# Altium integrated library BYTECH_HW_LIB_2019.IntLib: 907 symbols (part 1 of 6)
Pins are listed as number, name and electrical type; pins without a type are passive.

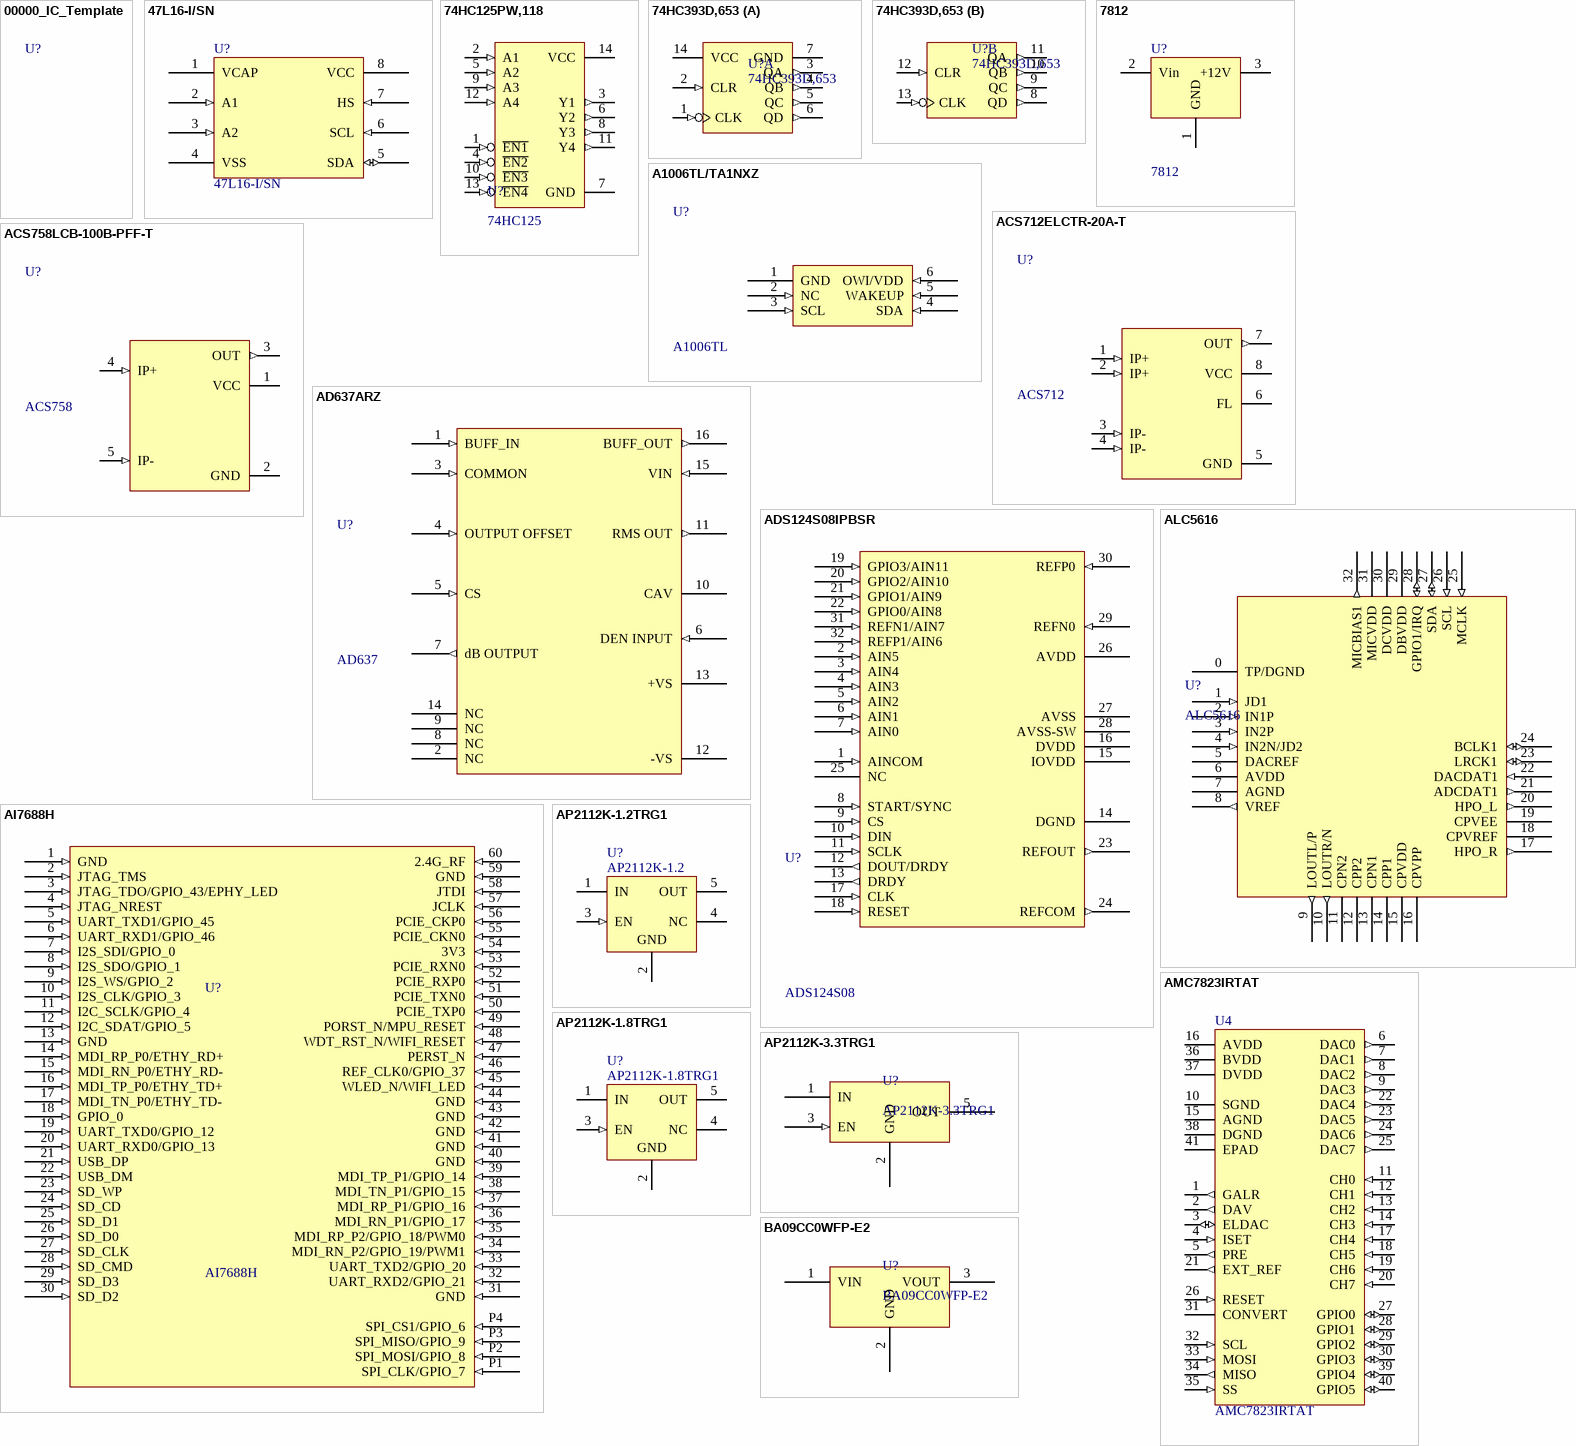
[diagram p0: symbols 00000_IC_Template to BA09CC0WFP-E2]

## 00000_IC_Template
designator U?
Solder: SMT; Category: IC
footprint SOIC-8

## 47L16-I/SN
designator U?
IC EERAM 16KBIT 1MHz SOIC-8; Solder: SMT; MPN: 47L16-I/SN; Value: 47L16-I/SN; Category: IC; PinCount: 8
footprint SOIC-8
pins: 1 VCAP, 2 A1 (in), 3 A2 (in), 4 VSS (power), 5 SDA (io), 6 SCL (in), 7 HS (in), 8 VCC (power)

## 74HC125PW,118
designator U?, comment 74HC125
Quad buffer/line driver; 3-state 14TSSOP; MPN: 74HC125PW,118; Solder: SMT; Value: 74HC125; Category: IC
footprint TSOP65P640X110-14M (TSOP, 14-Leads, Body 5.00x4.40mm, Pitch 0.65mm, IPC Low Density)
footprint TSOP65P640X120-14N (TSOP, 14-Leads, Body 5.00x4.40mm, Pitch 0.65mm, IPC Medium Density)
pins: 1 ~{EN1} (in), 2 A1 (in), 3 Y1 (out), 4 ~{EN2} (in), 5 A2 (in), 6 Y2 (out), 7 GND (power), 8 Y3 (out), 9 A3 (in), 10 ~{EN3} (in), 11 Y4 (out), 12 A4 (in), 13 ~{EN4} (in), 14 VCC (power)

## 74HC393D,653
designator U?
IC COUNTER DUAL 4BIT BIN 14SOIC; Solder: SMT; MPN: 74HC393D,653; Value: 74HC393D,653; Category: IC
footprint SOIC-14 (Small Outline IC (SOIC), 1.27 mm pitch; 14 pin, 8.65 mm L X 3.90 mm W X 1.75 mm H body)
part A pins: 1 CLK (in), 2 CLR (in), 3 QA (out), 4 QB (out), 5 QC (out), 6 QD (out), 7 GND (power), 14 VCC (power)
part B pins: 8 QD (out), 9 QC (out), 10 QB (out), 11 QA (out), 12 CLR (in), 13 CLK (in)

## 7812
designator U?
Positive Voltage Regulator; PinCount: 3
footprint HDR1x3 BIG (3 chan cam 7805, BJT to, FET to...)
pins: 1 GND, 2 Vin, 3 +12V

## A1006TL/TA1NXZ
designator U?, comment A1006TL
IC SECURE AUTHENTICATOR 6HXSON; MPN: A1006TL/TA1NXZ; MFR: NXP USA Inc.; Solder: SMT; Value: A1006TL; Category: IC; PinCount: 6
footprint 6-HXSON (SON, 6-Leads, Body 2.00x2.00mm, Pitch 0.65mm, Thermal Pad 1.60x1.00mm, IPC Medium Density)
pins: 1 GND, 2 NC (in), 3 SCL (in), 4 SDA (in), 5 WAKEUP (in), 6 OWI/VDD (in)

## ACS712ELCTR-20A-T
designator U?, comment ACS712
SENSOR CURRENT HALL 20A AC/DC; MPN: ACS712ELCTR-20A-T; MFR: Allegro; Solder: SMT; Value: ACS712; Category: IC; PinCount: 8
footprint SOIC-8
pins: 1 IP+ (in), 2 IP+ (in), 3 IP- (in), 4 IP- (in), 5 GND, 6 FL, 7 OUT (out), 8 VCC

## ACS758LCB-100B-PFF-T
designator U?, comment ACS758
SENSOR CURRENT HALL 100A AC/DC; MPN: ACS758LCB-100B-PFF-T; MFR: Allegro MicroSystems; Solder: SMT; Value: ACS758; Category: IC; PinCount: 5
footprint ACS758LCB (Footprint not found)
pins: 1 VCC, 2 GND, 3 OUT (out), 4 IP+ (in), 5 IP- (in)

## AD637ARZ
designator U?, comment AD637
IC RMS TO DC CONVERTER 16SOIC; MPN: AD637ARZ; MFR: Analog Devices Inc.; Solder: SMT; Value: AD637; Category: IC; PinCount: 16
footprint DW16_N (SOIC, 16-Leads, Body 10.3x7.5mm, Pitch 1.27mm, IPC Medium Density)
pins: 1 BUFF_IN (in), 2 NC, 3 COMMON (in), 4 OUTPUT OFFSET (in), 5 CS (in), 6 DEN INPUT (in), 7 dB OUTPUT (out), 8 NC, 9 NC, 10 CAV, 11 RMS OUT (out), 12 -VS (power), 13 +VS (power), 14 NC, 15 VIN (in), 16 BUFF_OUT (out)

## ADS124S08IPBSR
designator U?, comment ADS124S08
IC ADC 24BIT SIGMA-DELTA 32LQFP; MPN: ADS124S08IPBSR; MFR: Texas Instruments; Solder: SMT; Value: ADS124S08; Category: IC
footprint TSQFP50P700X700X120-32N (TSQFP, 32-Leads, Body 5.00x5.00mm, Pitch 0.50mm, IPC Medium Density)
pins: 1 AINCOM (in) "Common analog input for single-ended measurements", 2 AIN5 (in) "Analog input 5", 3 AIN4 (in) "Analog input 4", 4 AIN3 (in) "Analog input 3", 5 AIN2 (in) "Analog input 2", 6 AIN1 (in) "Analog input 1", 7 AIN0 (in) "Analog input 0", 8 START/SYNC (in) "Start conversion", 9 CS (in) "Chip select; active low", 10 DIN (in) "Serial data input", 11 SCLK (in) "Serial clock input", 12 DOUT/DRDY (out) "Serial data output combined with data ready; active low", 13 DRDY (out) "Data ready; active low", 14 DGND (power) "Digital ground", 15 IOVDD (power) "Digital I/O power supply.", 16 DVDD (power) "Digital core power supply. Connect a 100-nF (or larger) capacitor to DGND.", 17 CLK (in) "External clock input. Connect to DGND to use the internal oscillator.", 18 RESET (in) "Reset; active low", 19 GPIO3/AIN11 (in) "General-purpose I/O(2); analog input 11 (ADS124S08 only)", 20 GPIO2/AIN10 (in) "General-purpose I/O(2); analog input 10 (ADS124S08 only)", 21 GPIO1/AIN9 (in) "General-purpose I/O(2); analog input 9 (ADS124S08 only)", 22 GPIO0/AIN8 (in) "General-purpose I/O(2); analog input 8 (ADS124S08 only)", 23 REFOUT (out) "Positive voltage reference output.", 24 REFCOM (out) "Negative voltage reference output. Connect to AVSS.", 25 NC "Leave unconnected or connect to AVSS", 26 AVDD (power) "Positive analog power supply. Connect a 330-nF (or larger) capacitor to AVSS.", 27 AVSS (power) "Negative analog power supply", 28 AVSS-SW (power) "Negative analog power supply; low-side switch. Connect to AVSS.", 29 REFN0 (in) "Negative external reference input 0", 30 REFP0 (in) "Positive external reference input 0", 31 REFN1/AIN7 (in) "Negative external reference input 1; analog input 7 (ADS124S08 only)", 32 REFP1/AIN6 (in) "Positive external reference input 1; analog input 6 (ADS124S08 only)"

## AI7688H
designator U?
MT7688 IoT SiP Module; MFR: ACSIP; Solder: SMT; MPN: AI7688H; Value: AI7688H; Category: MODULE; PinCount: 60
footprint AI7688H
footprint AI7688H-NoAT (Footprint not found)
pins: 1 GND (in), 2 JTAG_TMS (in), 3 JTAG_TDO/GPIO_43/EPHY_LED (in), 4 JTAG_NREST (in), 5 UART_TXD1/GPIO_45 (in), 6 UART_RXD1/GPIO_46 (in), 7 I2S_SDI/GPIO_0 (in), 8 I2S_SDO/GPIO_1 (in), 9 I2S_WS/GPIO_2 (in), 10 I2S_CLK/GPIO_3 (in), 11 I2C_SCLK/GPIO_4 (in), 12 I2C_SDAT/GPIO_5 (in), 13 GND (in), 14 MDI_RP_P0/ETHY_RD+ (in), 15 MDI_RN_P0/ETHY_RD- (in), 16 MDI_TP_P0/ETHY_TD+ (in), 17 MDI_TN_P0/ETHY_TD- (in), 18 GPIO_0 (in), 19 UART_TXD0/GPIO_12 (in), 20 UART_RXD0/GPIO_13 (in), 21 USB_DP (in), 22 USB_DM (in), 23 SD_WP (in), 24 SD_CD (in), 25 SD_D1 (in), 26 SD_D0 (in), 27 SD_CLK (in), 28 SD_CMD (in), 29 SD_D3 (in), 30 SD_D2 (in), 31 GND (in), 32 UART_RXD2/GPIO_21 (in), 33 UART_TXD2/GPIO_20 (in), 34 MDI_RN_P2/GPIO_19/PWM1 (in), 35 MDI_RP_P2/GPIO_18/PWM0 (in), 36 MDI_RN_P1/GPIO_17 (in), 37 MDI_RP_P1/GPIO_16 (in), 38 MDI_TN_P1/GPIO_15 (in), 39 MDI_TP_P1/GPIO_14 (in), 40 GND (in), 41 GND (in), 42 GND (in), 43 GND (in), 44 GND (in), 45 WLED_N/WIFI_LED (in), 46 REF_CLK0/GPIO_37 (in), 47 PERST_N (in), 48 WDT_RST_N/WIFI_RESET (in), 49 PORST_N/MPU_RESET (in), 50 PCIE_TXP0 (in), 51 PCIE_TXN0 (in), 52 PCIE_RXP0 (in), 53 PCIE_RXN0 (in), 54 3V3 (in), 55 PCIE_CKN0 (in), 56 PCIE_CKP0 (in), 57 JCLK (in), 58 JTDI (in), 59 GND (in), 60 2.4G_RF (in), P1 SPI_CLK/GPIO_7 (in), P2 SPI_MOSI/GPIO_8 (in), P3 SPI_MISO/GPIO_9 (in), P4 SPI_CS1/GPIO_6 (in)

## ALC5616
designator U?
Solder: SMT
footprint VFQFN-32 (32-VFQFN Exposed Pad)
pins: 0 TP/DGND (power) "Analog ground", 1 JD1 (in) "First jack detection pin", 2 IN1P (in) "Single-end input for microphone 1", 3 IN2P (in) ""Positive differential input for microphone / 2 / Left channel line input"", 4 IN2N/JD2 (in) ""Negative differential input for / microphone 2 / Right channel line input / Second jack detection pin"", 5 DACREF (power) "Analog power", 6 AVDD (power) "Analog power", 7 AGND (power) "Analog ground", 8 VREF (out) "Internal reference voltage", 9 LOUTL/P (out) ""Line output type / Left channel single-end output / Positive channel differential output"", 10 LOUTR/N (out) ""Line output type / Right channel single-end output / Negative channel differential output"", 11 CPN2 "Second charge pump bucket capacitor", 12 CPP2 "Second charge pump bucket capacitor", 13 CPN1 "First charge pump bucket capacitor", 14 CPP1 "First charge pump bucket capacitor", 15 CPVDD (power) ""Analog power for headphone charge / pump"", 16 CPVPP (power) "Charge pump positive voltage output", 17 HPO_R (out) ""Headphone amplifier output / Right channel"", 18 CPVREF "Headphone reference ground", 19 CPVEE (power) "Charge pump negative voltage output", 20 HPO_L (out) ""Headphone amplifier output / Left channel"", 21 ADCDAT1 (out) "First I2S interface serial data output", 22 DACDAT1 (in) "First I2S interface serial data input", 23 LRCK1 (io) "First I2S interface synchronous signal", 24 BCLK1 (io) "First I2S interface serial bit clock", 25 MCLK (in) "I2S interface master clock input", 26 SCL (in) "I2C interface clock input", 27 SDA (io) "I2C interface serial data", 28 GPIO1/IRQ (io) ""General purpose input and output / Interrupt output"", 29 DBVDD (power) "Digital power for digital I/O buffer", 30 DCVDD (power) "Digital power for digital core.", 31 MICVDD (power) "Analog power for MICBIAS", 32 MICBIAS1 (out) "Bias voltage output for microphone"

## AMC7823IRTAT
designator U4
IC ANLG MON/CTL 12B 200K 40WQFN; Solder: SMT; MPN: AMC7823IRTAT; Value: AMC7823IRTAT; Category: IC
footprint 40-WQFN (WFN, 40-lead, Body 6x6 mm, 0.5 mm pitch,IPC High Density)
pins: 1 GALR (out), 2 DAV (out), 3 ELDAC (io), 4 ISET (in), 5 PRE (out), 6 DAC0 (out), 7 DAC1 (out), 8 DAC2 (out), 9 DAC3 (out), 10 SGND (power), 11 CH0 (in), 12 CH1 (in), 13 CH2 (in), 14 CH3 (in), 15 AGND (power), 16 AVDD (power), 17 CH4 (in), 18 CH5 (in), 19 CH6 (in), 20 CH7 (in), 21 EXT_REF (out), 22 DAC4 (out), 23 DAC5 (out), 24 DAC6 (out), 25 DAC7 (out), 26 RESET (in), 27 GPIO0 (io), 28 GPIO1 (io), 29 GPIO2 (io), 30 GPIO3 (io), 31 CONVERT, 32 SCL (in), 33 MOSI (in), 34 MISO (out), 35 SS (in), 36 BVDD (power), 37 DVDD (power), 38 DGND (power), 39 GPIO4 (io), 40 GPIO5 (io), 41 EPAD (power)

## AP2112K-1.2TRG1
designator U?, comment AP2112K-1.2
Single Output LDO, 300 mA, Fixed 1.2V Output, 2 to 5.5 V Input; MPN: AP2112K-1.2TRG1; Solder: SMT; Value: AP2112K-1.2; Category: IC
footprint SOT23-5
pins: 1 IN (power) "Input supply voltage", 2 GND (power) "Ground", 3 EN (in) "Enable input", 4 NC "No connected", 5 OUT (power) "Regulated output voltage"

## AP2112K-1.8TRG1
designator U?
Single Output LDO, 300 mA, Fixed 1.8 V Output, 2 to 5.5 V Input; Solder: SMT; MPN: AP2112K-1.8TRG1; Value: AP2112K-1.8TRG1; Category: IC
footprint SOT23-5
pins: 1 IN (power) "Input supply voltage", 2 GND (power) "Ground", 3 EN (in) "Enable input", 4 NC "No connected", 5 OUT (power) "Regulated output voltage"

## AP2112K-3.3TRG1
designator U?
IC REG LDO 3.3V 0.6A SOT25; Solder: SMT; MPN: AP2112K-3.3TRG1; Value: AP2112K-3.3TRG1; Category: IC
footprint SOT23-5
pins: 1 IN (power), 2 GND (power), 3 EN (in), 5 OUT (power)

## BA09CC0WFP-E2
designator U?
LDO Voltage Regulators REG 1A 9V; Solder: SMT; MPN: BA09CC0WFP-E2; Value: BA09CC0WFP-E2; Category: IC
footprint TO-252-3
pins: 1 VIN, 2 GND, 3 VOUT

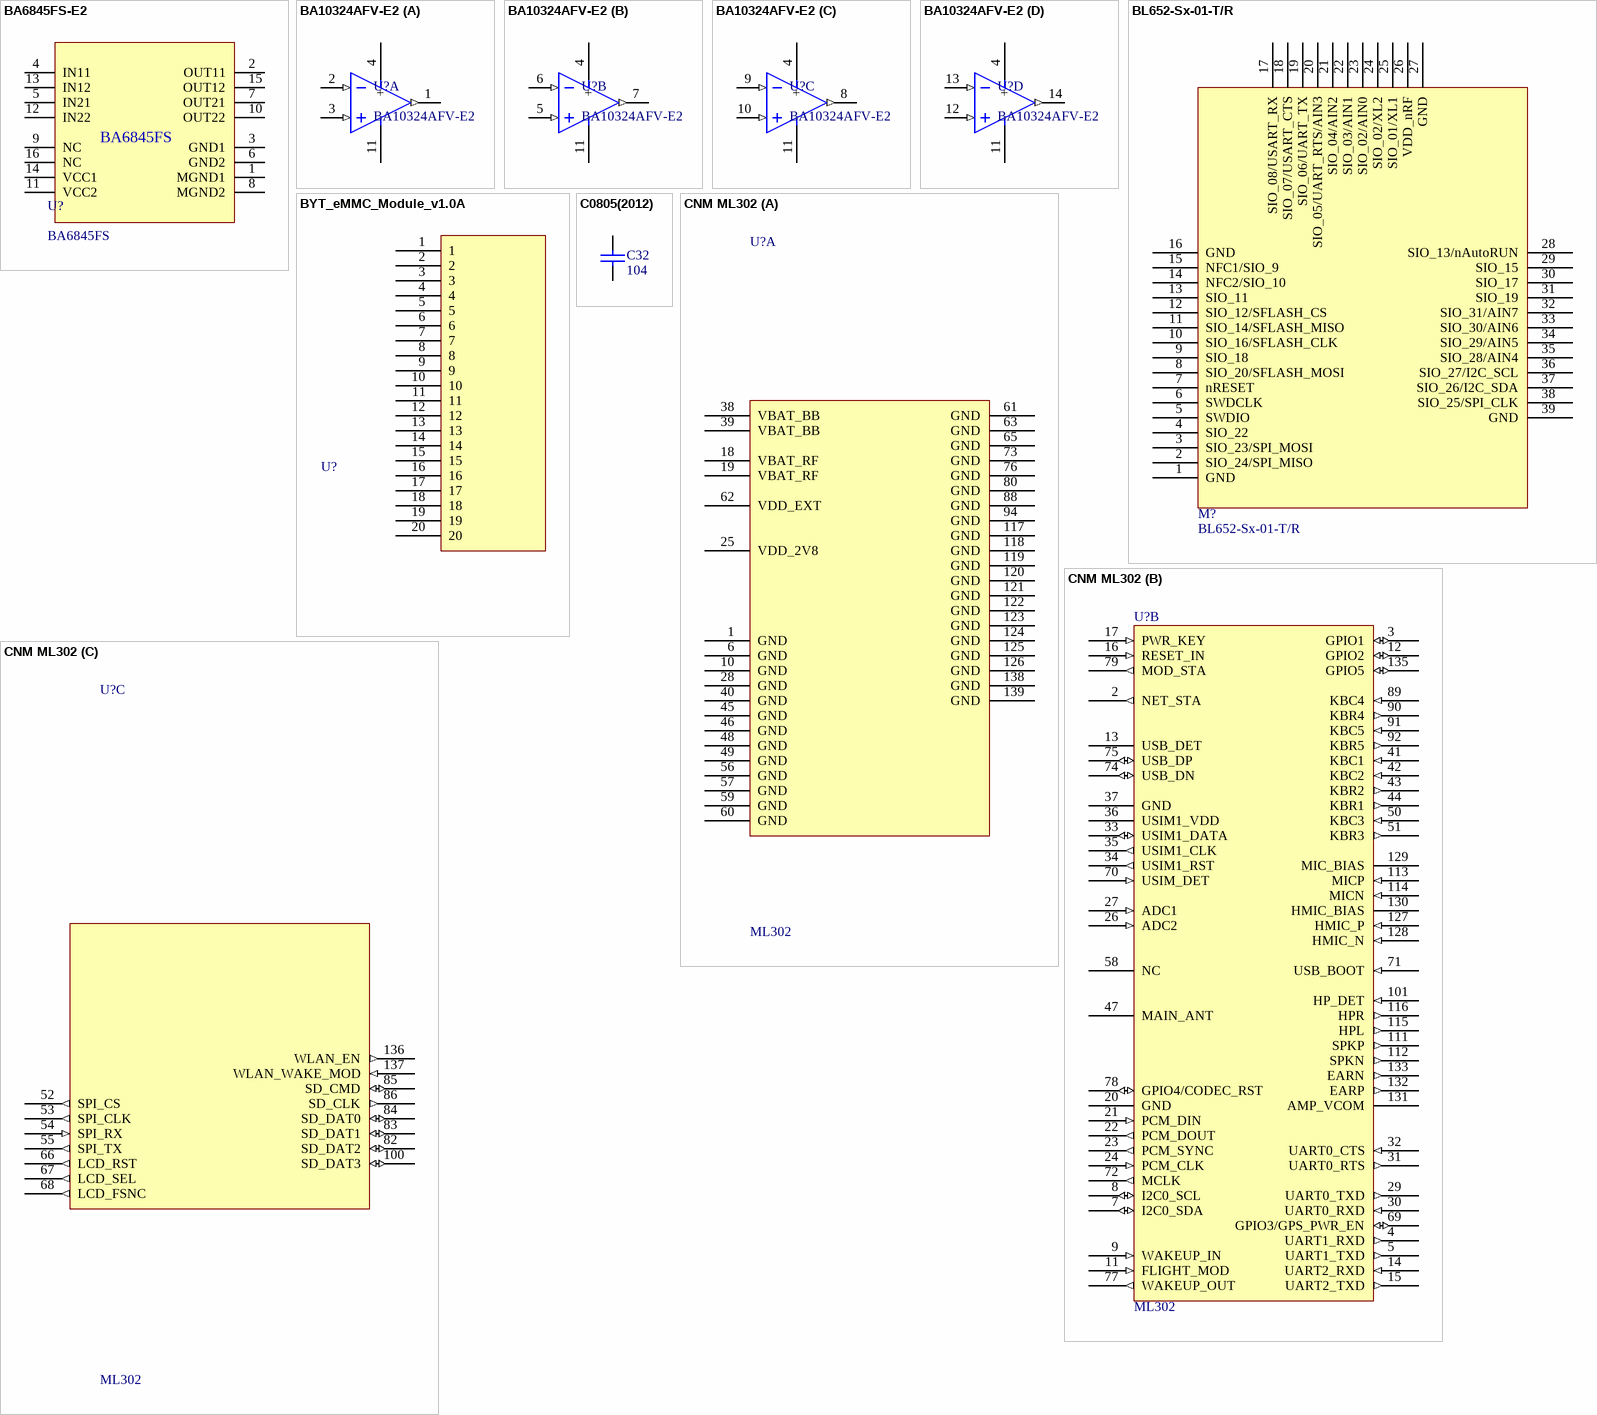
[diagram p1: symbols BA6845FS-E2 to CNM ML302]

## BA6845FS-E2
designator U?, comment BA6845FS
IC MOTOR DRIVER PAR 16SSOP - Stepping motor driver; MPN: BA6845FS-E2; Solder: SMT; Value: BA6845FS; Category: IC
footprint SSOP-A16 (SSOP-A16 IC PACKAGE)
pins: 1 MGND1, 2 OUT11, 3 GND1, 4 IN11, 5 IN21, 6 GND2, 7 OUT21, 8 MGND2, 9 NC, 10 OUT22, 11 VCC2, 12 IN22, 13 IN12, 14 VCC1, 15 OUT12, 16 NC

## BA10324AFV-E2
designator U?
IC OPAMP DIFF 500KHZ 14SSOP; MFR: ROHM; Solder: SMT; MPN: BA10324AFV-E2; Category: IC; Value: BA10324AFV-E2
footprint 14-SSOPB (Footprint not found)
part A pins: 1 OUT (out), 2 IN- (in), 3 IN+ (in), 4 + (power), 11 VEE (power)
part B pins: 4 + (power), 5 IN+ (in), 6 IN- (in), 7 OUT (out), 11 VEE (power)
part C pins: 4 + (power), 8 OUT (out), 9 IN- (in), 10 IN+ (in), 11 VEE (power)
part D pins: 4 + (power), 11 VEE (power), 12 IN+ (in), 13 IN- (in), 14 OUT (out)

## BL652-Sx-01-T/R
designator M?
Solder: SMT; Value: BL652-Sx-01-T/R
footprint BL652-Sx-01-T/R
pins: 1 GND (power), 2 SIO_24/SPI_MISO (power), 3 SIO_23/SPI_MOSI (power), 4 SIO_22 (power), 5 SWDIO (power), 6 SWDCLK (power), 7 nRESET (power), 8 SIO_20/SFLASH_MOSI (power), 9 SIO_18 (power), 10 SIO_16/SFLASH_CLK (power), 11 SIO_14/SFLASH_MISO (power), 12 SIO_12/SFLASH_CS (power), 13 SIO_11 (power), 14 NFC2/SIO_10 (power), 15 NFC1/SIO_9 (power), 16 GND (power), 17 SIO_08/USART_RX (power), 18 SIO_07/USART_CTS (power), 19 SIO_06/UART_TX (power), 20 SIO_05/UART_RTS/AIN3 (power), 21 SIO_04/AIN2 (power), 22 SIO_03/AIN1 (power), 23 SIO_02/AIN0 (power), 24 SIO_02/XL2 (power), 25 SIO_01/XL1 (power), 26 VDD_nRF (power), 27 GND (power), 28 SIO_13/nAutoRUN (power), 29 SIO_15 (power), 30 SIO_17 (power), 31 SIO_19 (power), 32 SIO_31/AIN7 (power), 33 SIO_30/AIN6 (power), 34 SIO_29/AIN5 (power), 35 SIO_28/AIN4 (power), 36 SIO_27/I2C_SCL (power), 37 SIO_26/I2C_SDA (power), 38 SIO_25/SPI_CLK (power), 39 GND (power)

## BYT_eMMC_Module_v1.0A
designator U?
MPN: BYT-eMMC; Solder: SMT; Category: IC
footprint BYT-eMMC (Footprint not found)
pins: 1, 2, 3, 4, 5, 6, 7, 8, 9, 10, 11, 12, 13, 14, 15, 16, 17, 18, 19, 20

## C0805(2012)
designator C32, comment 104
Capacitor SMD 0805(2012); Value: 33p; Published: 8-Jun-2000; LatestRevisionDate: 17-Jul-2002; LatestRevisionNote: Re-released for DXP Platform.; PackageReference: RAD-0.3; Publisher: Altium Limited
simulation model CAP (Capacitor)
signal-integrity model Cap
footprint CAP_CERAMIC_0805(2012mm)
pins: 1, 2

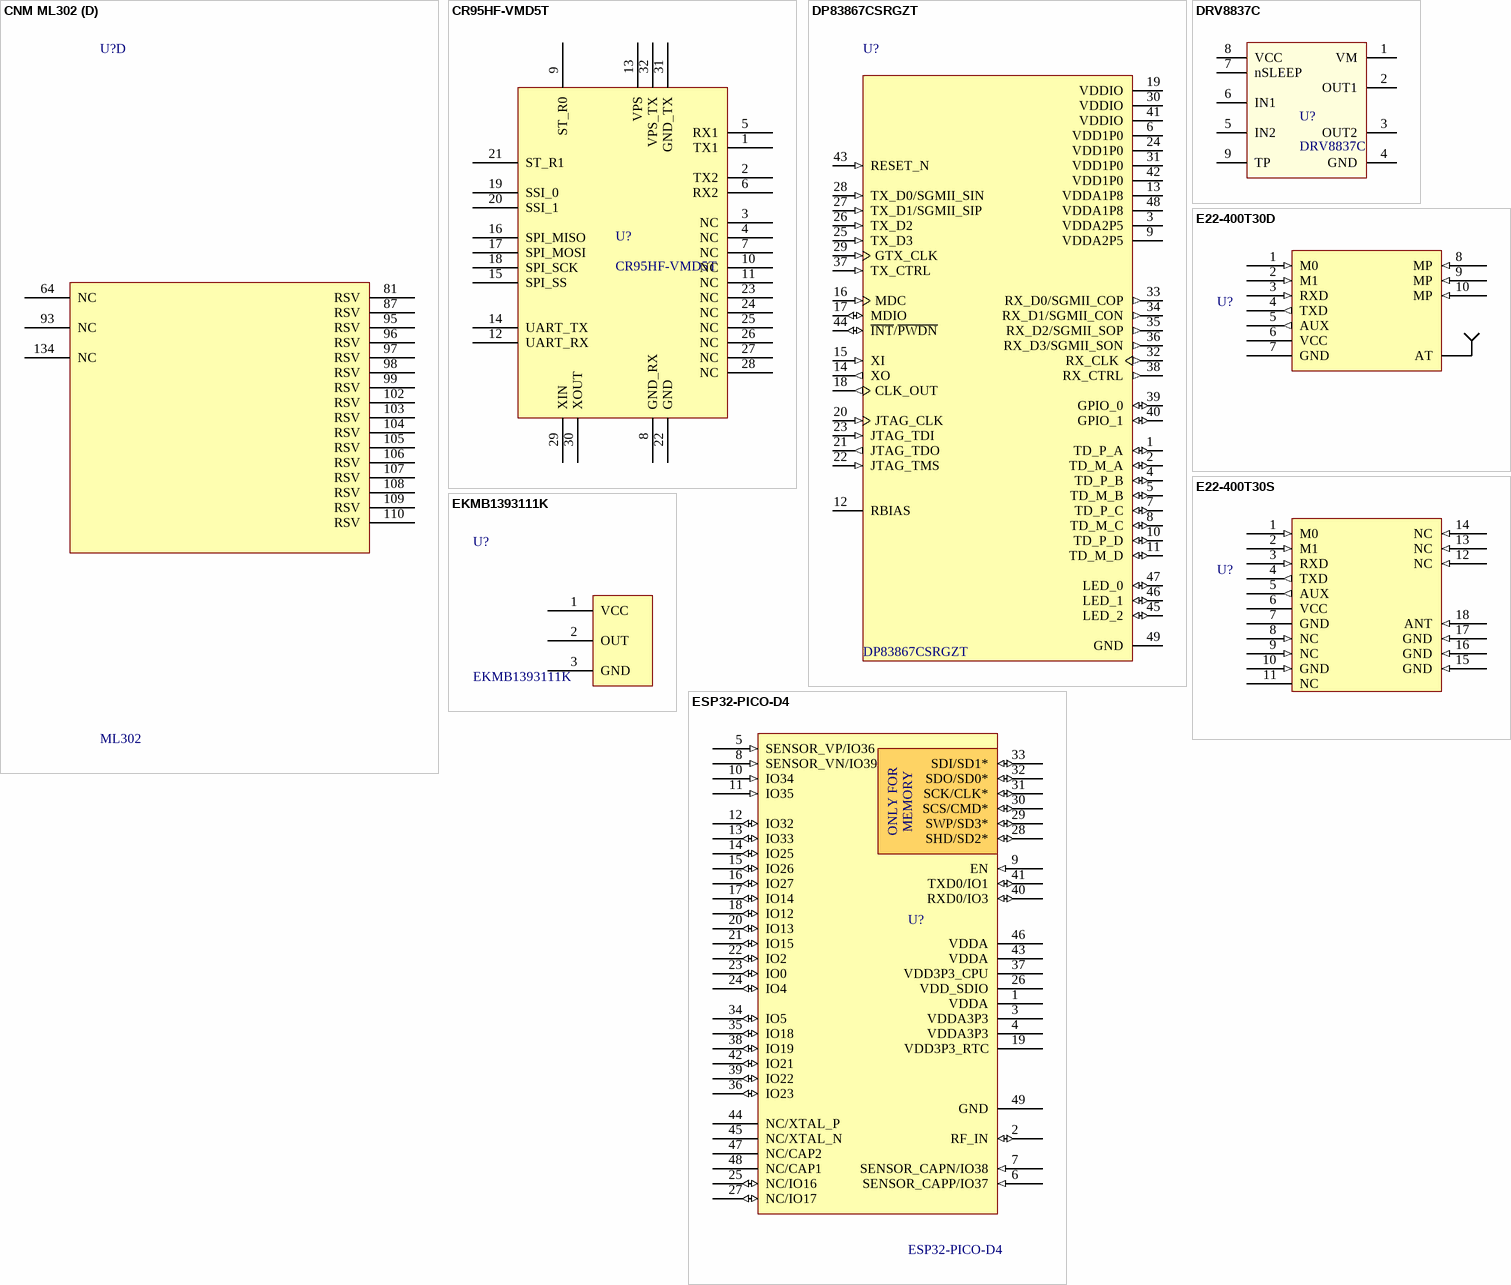
[diagram p2: symbols CNM ML302 to ESP32-PICO-D4]

## CNM ML302
designator U?, comment ML302
LTE CAT 1 Module, B1/B3/B5/B8; MFR: China Mobile; Solder: SMT; Value: ML302; MPN: ML302; Category: MODULE
footprint CNM_ML302 (Footprint not found)
part A pins: 1 GND (power), 6 GND (power), 10 GND (power), 18 VBAT_RF (power), 19 VBAT_RF (power), 25 VDD_2V8 (power), 28 GND (power), 38 VBAT_BB (power), 39 VBAT_BB (power), 40 GND (power), 45 GND (power), 46 GND (power), 48 GND (power), 49 GND (power), 56 GND (power), 57 GND (power), 59 GND (power), 60 GND (power), 61 GND (power), 62 VDD_EXT (power), 63 GND (power), 65 GND (power), 73 GND (power), 76 GND (power), 80 GND (power), 88 GND (power), 94 GND (power), 117 GND (power), 118 GND (power), 119 GND (power), 120 GND (power), 121 GND (power), 122 GND (power), 123 GND (power), 124 GND (power), 125 GND (power), 126 GND (power), 138 GND (power), 139 GND (power)
part B pins: 2 NET_STA (out), 3 GPIO1 (io), 4 UART1_RXD (out), 5 UART1_TXD (out), 7 I2C0_SDA (io), 8 I2C0_SCL (io), 9 WAKEUP_IN (in), 11 FLIGHT_MOD (in), 12 GPIO2 (io), 13 USB_DET (power), 14 UART2_RXD (in), 15 UART2_TXD (out), 16 RESET_IN (in), 17 PWR_KEY (in), 20 GND (power), 21 PCM_DIN (in), 22 PCM_DOUT (out), 23 PCM_SYNC (out), 24 PCM_CLK (in), 26 ADC2 (in), 27 ADC1 (in), 29 UART0_TXD (out), 30 UART0_RXD (in), 31 UART0_RTS (out), 32 UART0_CTS (in), 33 USIM1_DATA (io), 34 USIM1_RST (out), 35 USIM1_CLK (out), 36 USIM1_VDD (power), 37 GND (power), 41 KBC1 (in), 42 KBC2 (in), 43 KBR2 (out), 44 KBR1 (out), 47 MAIN_ANT, 50 KBC3 (in), 51 KBR3 (out), 58 NC, 69 GPIO3/GPS_PWR_EN (io), 70 USIM_DET (in), 71 USB_BOOT (in), 72 MCLK (out), 74 USB_DN (io), 75 USB_DP (io), 77 WAKEUP_OUT (out), 78 GPIO4/CODEC_RST (io), 79 MOD_STA (out), 89 KBC4 (in), 90 KBR4 (out), 91 KBC5 (in), 92 KBR5 (out), 101 HP_DET (in), 111 SPKP (out), 112 SPKN (out), 113 MICP (in), 114 MICN (in), 115 HPL (out), 116 HPR (out), 127 HMIC_P (in), 128 HMIC_N (in), 129 MIC_BIAS (power), 130 HMIC_BIAS (power), 131 AMP_VCOM, 132 EARP (out), 133 EARN (out), 135 GPIO5 (io)
part C pins: 52 SPI_CS (out), 53 SPI_CLK (out), 54 SPI_RX (in), 55 SPI_TX (out), 66 LCD_RST (out), 67 LCD_SEL (out), 68 LCD_FSNC (out), 82 SD_DAT2 (io), 83 SD_DAT1 (io), 84 SD_DAT0 (io), 85 SD_CMD (io), 86 SD_CLK (out), 100 SD_DAT3 (io), 136 WLAN_EN (out), 137 WLAN_WAKE_MOD (in)
part D pins: 64 NC, 81 RSV, 87 RSV, 93 NC, 95 RSV, 96 RSV, 97 RSV, 98 RSV, 99 RSV, 102 RSV, 103 RSV, 104 RSV, 105 RSV, 106 RSV, 107 RSV, 108 RSV, 109 RSV, 110 RSV, 134 NC

## CR95HF-VMD5T
designator U?
TRANSCEIVER 13.56MHZ 32-VFQFPN; Solder: SMT; Value: CR95HF-VMD5T; MPN: CR95HF-VMD5T; Category: IC
footprint VFQFN-32 (32-VFQFN Exposed Pad)
pins: 1 TX1, 2 TX2, 3 NC, 4 NC, 5 RX1, 6 RX2, 7 NC, 8 GND_RX, 9 ST_R0, 10 NC, 11 NC, 12 UART_RX, 13 VPS, 14 UART_TX, 15 SPI_SS, 16 SPI_MISO, 17 SPI_MOSI, 18 SPI_SCK, 19 SSI_0, 20 SSI_1, 21 ST_R1, 22 GND, 23 NC, 24 NC, 25 NC, 26 NC, 27 NC, 28 NC, 29 XIN, 30 XOUT, 31 GND_TX, 32 VPS_TX

## DP83867CSRGZT
designator U?
IC ETHERNET PHY 48VQFN; MF: Texas Instruments; Digi-Key_Part_Number: 296-43820-1-ND; MP: DP83867CSRGZT; SnapEDA_Link: https://www.snapeda.com/parts/DP83867CSRGZT/Texas%20Instruments/view-part/381146/?ref=snap; Digi-Key_Purchase_URL: https://www.digikey.com/product-detail/en/texas-instruments/DP83867CSRGZT/296-43820-1-ND/5872927?utm_source=snapeda&utm_medium=aggregator&utm_campaign=symbol; Package: VQFN-48 Texas Instruments; Value: *
footprint QFN50P700X700X100-49N
pins: 1 TD_P_A (io), 2 TD_M_A (io), 3 VDDA2P5 (power), 4 TD_P_B (io), 5 TD_M_B (io), 6 VDD1P0 (power), 7 TD_P_C (io), 8 TD_M_C (io), 9 VDDA2P5 (power), 10 TD_P_D (io), 11 TD_M_D (io), 12 RBIAS, 13 VDDA1P8 (power), 14 XO (out), 15 XI (in), 16 MDC (in), 17 MDIO (io), 18 CLK_OUT (out), 19 VDDIO (power), 20 JTAG_CLK (in), 21 JTAG_TDO (out), 22 JTAG_TMS (in), 23 JTAG_TDI (in), 24 VDD1P0 (power), 25 TX_D3 (in), 26 TX_D2 (in), 27 TX_D1/SGMII_SIP (in), 28 TX_D0/SGMII_SIN (in), 29 GTX_CLK (in), 30 VDDIO (power), 31 VDD1P0 (power), 32 RX_CLK (out), 33 RX_D0/SGMII_COP (out), 34 RX_D1/SGMII_CON (out), 35 RX_D2/SGMII_SOP (out), 36 RX_D3/SGMII_SON (out), 37 TX_CTRL (in), 38 RX_CTRL (out), 39 GPIO_0 (io), 40 GPIO_1 (io), 41 VDDIO (power), 42 VDD1P0 (power), 43 RESET_N (in), 44 ~{INT}/~{PWDN} (io), 45 LED_2 (io), 46 LED_1 (io), 47 LED_0 (io), 48 VDDA1P8 (power), 49 GND (power)

## DRV8837C
designator U?
IC HALF-BRIDGE DRVR PWM 8WSON; MPN: DRV8837CDSGR; MFR: Texas Instruments; Solder: SMT; Category: IC; Value: DRV8837C
footprint 8WSON-2x2 (Footprint not found)
pins: 1 VM, 2 OUT1, 3 OUT2, 4 GND, 5 IN2, 6 IN1, 7 nSLEEP, 8 VCC, 9 TP

## E22-400T30D
designator U?
LORA MODULE 410.125～ 493.125MHz 100mW; MPN: E22-400T30D/E32-433T20D; MFR: EBYTE; Solder: SMT; Category: IC
footprint EBYTE_E22_E32_DIP (Footprint not found)
pins: 1 M0 (in), 2 M1 (in), 3 RXD (in), 4 TXD (out), 5 AUX (out), 6 VCC (power), 7 GND (power), 8 MP (in), 9 MP (in), 10 MP (in), ?1 AT

## E22-400T30S
designator U?
LORA MODULE 410.125～ 493.125MHz 100mW; MPN: E22-400T30S; MFR: EBYTE; Solder: SMT; Category: IC
footprint EBYTE_E22-400T30S (Footprint not found)
pins: 1 M0 (in), 2 M1 (in), 3 RXD (in), 4 TXD (out), 5 AUX (out), 6 VCC (power), 7 GND (power), 8 NC (in), 9 NC (in), 10 GND (in), 11 NC, 12 NC (in), 13 NC (in), 14 NC (in), 15 GND (in), 16 GND (in), 17 GND (in), 18 ANT (in)

## EKMB1393111K
designator U?
SENSOR MOTION PIR STD WHT LENS S; MFR: Panasonic Electric Works; Solder: HAND; MPN: EKMB1393111K; Value: EKMB1393111K; Category: IC; PinCount: 3
footprint EKMB1393111K (Footprint not found)
pins: 1 VCC, 2 OUT, 3 GND

## ESP32-PICO-D4
designator U?
ESP32 WIFI BLUETOOTH; MFR: Espressif; Solder: SMT; Category: MODULE; MPN: ESP32-PICO-D4; PinCount: 48; Value: ESP32-PICO-D4
footprint ESP32-PICO-D4 (Footprint not found)
pins: 1 VDDA (power) "Power supply", 2 RF_IN (io) "Power supply", 3 VDDA3P3 (power) "Power supply", 4 VDDA3P3 (power) "Power supply", 5 SENSOR_VP/IO36 (in) "GPIO36, ADC1_CH0, RTC_GPIO0", 6 SENSOR_CAPP/IO37 (in) "GPIO39, ADC1_CH3, RTC_GPIO3", 7 SENSOR_CAPN/IO38 (in) "GPIO39, ADC1_CH3, RTC_GPIO3", 8 SENSOR_VN/IO39 (in) "GPIO39, ADC1_CH3, RTC_GPIO3", 9 EN (in) "Module-enable signal. Active high.", 10 IO34 (in) "GPIO34, ADC1_CH6, RTC_GPIO4", 11 IO35 (in) "GPIO35, ADC1_CH7, RTC_GPIO5", 12 IO32 (io) "GPIO32, XTAL_32K_P, ADC1_CH4, TOUCH9, RTC_GPIO9", 13 IO33 (io) "GPIO33, XTAL_32K_N, ADC1_CH5,TOUCH8, RTC_GPIO8", 14 IO25 (io) "GPIO25, DAC_1, ADC2_CH8, RTC_GPIO6, EMAC_RXD0", 15 IO26 (io) "GPIO26, DAC_2, ADC2_CH9, RTC_GPIO7, EMAC_RXD1", 16 IO27 (io) "GPIO27, ADC2_CH7, TOUCH7, RTC_GPIO17, EMAC_RX_DV", 17 IO14 (io) "GPIO14, ADC2_CH6, TOUCH6, RTC_GPIO16, MTMS, HSPICLK, HS2_CLK, SD_CLK, EMAC_TXD2", 18 IO12 (io) "GPIO12, ADC2_CH5, TOUCH5, RTC_GPIO15, MTDI, HSPIQ, HS2_DATA2, SD_DATA2, EMAC_TXD3", 19 VDD3P3_RTC (power) "Power supply", 20 IO13 (io) "GPIO13, ADC2_CH4, TOUCH4, RTC_GPIO14, MTCK, HSPID, HS2_DATA3,SD_DATA3, EMAC_RX_ER", 21 IO15 (io) "GPIO15, ADC2_CH3, TOUCH3, MTDO, HSPICS0, RTC_GPIO13, HS2_CMD,SD_CMD, EMAC_RXD3", 22 IO2 (io) "GPIO2, ADC2_CH2, TOUCH2, RTC_GPIO12, HSPIWP, HS2_DATA0,SD_DATA0", 23 IO0 (io) "GPIO0, ADC2_CH1, TOUCH1, RTC_GPIO11, CLK_OUT1, EMAC_TX_CLK", 24 IO4 (io) "GPIO4, ADC2_CH0, TOUCH0, RTC_GPIO10, HSPIHD, HS2_DATA1,SD_DATA1, EMAC_TX_ER", 25 NC/IO16 (io) "GPIO4, ADC2_CH0, TOUCH0, RTC_GPIO10, HSPIHD, HS2_DATA1,SD_DATA1, EMAC_TX_ER", 26 VDD_SDIO (power) "Power supply", 27 NC/IO17 (io) "GPIO16, HS1_DATA4, U2RXD, EMAC_CLK_OUT", 28 SHD/SD2* (io) "GPIO9, SD_DATA2, SPIHD, HS1_DATA2, U1RXD", 29 SWP/SD3* (io) "GPIO10, SD_DATA3, SPIWP, HS1_DATA3, U1TXD", 30 SCS/CMD* (io) "GPIO11, SD_CMD, SPICS0, HS1_CMD, U1RTS", 31 SCK/CLK* (io) "GPIO6, SD_CLK, SPICLK, HS1_CLK, U1CTS", 32 SDO/SD0* (io) "GPIO7, SD_DATA0, SPIQ, HS1_DATA0, U2RTS", 33 SDI/SD1* (io) "GPIO8, SD_DATA1, SPID, HS1_DATA1, U2CTS", 34 IO5 (io) "GPIO5, VSPICS0, HS1_DATA6, EMAC_RX_CLK", 35 IO18 (io) "GPIO18, VSPICLK, HS1_DATA7", 36 IO23 (io) "GPIO23, VSPID, HS1_STROBE", 37 VDD3P3_CPU (power) "NC", 38 IO19 (io) "GPIO19, VSPIQ, U0CTS, EMAC_TXD0", 39 IO22 (io) "GPIO22, VSPIWP, U0RTS, EMAC_TXD1", 40 RXD0/IO3 (io) "GPIO3, U0RXD, CLK_OUT2", 41 TXD0/IO1 (io) "GPIO1, U0TXD, CLK_OUT3, EMAC_RXD2", 42 IO21 (io) "GPIO21, VSPIHD, EMAC_TX_EN", 43 VDDA (power) "NC", 44 NC/XTAL_P "GPIO23, VSPID, HS1_STROBE", 45 NC/XTAL_N "GPIO23, VSPID, HS1_STROBE", 46 VDDA (power) "NC", 47 NC/CAP2 "GPIO23, VSPID, HS1_STROBE", 48 NC/CAP1 "GPIO23, VSPID, HS1_STROBE", 49 GND (power)
text: ONLY FOR; MEMORY

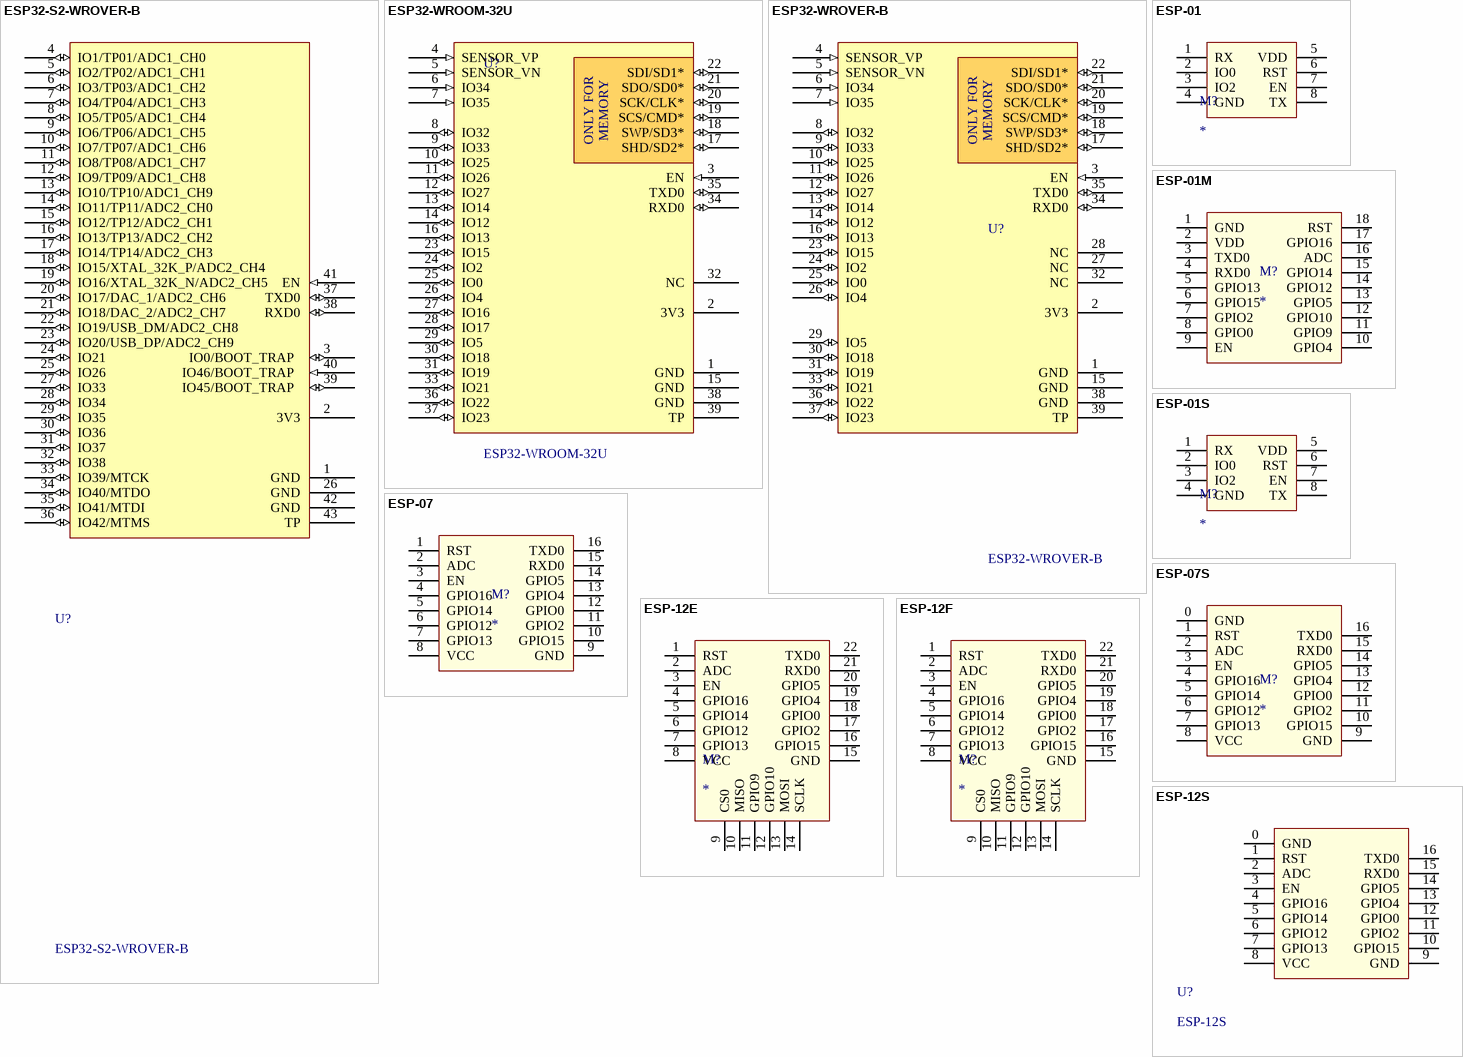
[diagram p3: symbols ESP32-S2-WROVER-B to ESP-12S]

## ESP32-S2-WROVER-B
designator U?
SMD MODULE ESP32-WROVER-B, ESP32; MFR: Espressif; Solder: SMT; Category: MODULE; MPN: ESP32-S2-WROVER-B; PinCount: 43; Value: ESP32-S2-WROVER-B
footprint ESP32-S2-WROVER (Footprint not found)
pins: 1 GND (power) "Ground", 2 3V3 (power) "Power supply", 3 IO0/BOOT_TRAP   (io) "RTC_GPIO0, GPIO0", 4 IO1/TP01/ADC1_CH0   (io) "RTC_GPIO1, GPIO1, TOUCH1, ADC1_CH0", 5 IO2/TP02/ADC1_CH1   (io) "RTC_GPIO2, GPIO2, TOUCH2, ADC1_CH1", 6 IO3/TP03/ADC1_CH2   (io) "RTC_GPIO3, GPIO3, TOUCH3, ADC1_CH2", 7 IO4/TP04/ADC1_CH3   (io) "RTC_GPIO4, GPIO4, TOUCH4, ADC1_CH3", 8 IO5/TP05/ADC1_CH4   (io) "RTC_GPIO5, GPIO5, TOUCH5, ADC1_CH4", 9 IO6/TP06/ADC1_CH5 (io) "RTC_GPIO6, GPIO6, TOUCH6, ADC1_CH5", 10 IO7/TP07/ADC1_CH6   (io) "RTC_GPIO7, GPIO7, TOUCH7, ADC1_CH6", 11 IO8/TP08/ADC1_CH7   (io) "RTC_GPIO8, GPIO8, TOUCH8, ADC1_CH7", 12 IO9/TP09/ADC1_CH8   (io) "RTC_GPIO9, GPIO9, TOUCH9, ADC1_CH8, FSPIHD", 13 IO10/TP10/ADC1_CH9   (io) "RTC_GPIO10, GPIO10, TOUCH10, ADC1_CH9, FSPICS0, FSPIIO4", 14 IO11/TP11/ADC2_CH0   (io) "RTC_GPIO11, GPIO11, TOUCH11, ADC2_CH0, FSPID, FSPIIO5", 15 IO12/TP12/ADC2_CH1   (io) "RTC_GPIO12, GPIO12, TOUCH12, ADC2_CH1, FSPICLK, FSPIIO6", 16 IO13/TP13/ADC2_CH2   (io) "RTC_GPIO13, GPIO13, TOUCH13, ADC2_CH2, FSPIQ, FSPIIO7", 17 IO14/TP14/ADC2_CH3   (io) "RTC_GPIO14, GPIO14, TOUCH14, ADC2_CH3, FSPIWP, FSPIDQS", 18 IO15/XTAL_32K_P/ADC2_CH4   (io) "RTC_GPIO15, GPIO15, U0RTS, ADC2_CH4, XTAL_32K_P", 19 IO16/XTAL_32K_N/ADC2_CH5   (io) "RTC_GPIO16, GPIO16, U0CTS, ADC2_CH5, XTAL_32K_N", 20 IO17/DAC_1/ADC2_CH6   (io) "RTC_GPIO17, GPIO17, U1TXD, ADC2_CH6, DAC_1", 21 IO18/DAC_2/ADC2_CH7   (io) "RTC_GPIO18, GPIO18, U1RXD, ADC2_CH7, DAC_2, CLK_OUT3", 22 IO19/USB_DM/ADC2_CH8   (io) "RTC_GPIO19, GPIO19, U1RTS, ADC2_CH8, CLK_OUT2, USB_D", 23 IO20/USB_DP/ADC2_CH9   (io) "RTC_GPIO20, GPIO20, U1CTS, ADC2_CH9, CLK_OUT1, USB_D+", 24 IO21   (io) "RTC_GPIO21, GPIO21", 25 IO26 (io) "SPICS1, GPIO26", 26 GND (power) "Ground", 27 IO33 (io) "SPIIO4, GPIO33, FSPIHD", 28 IO34 (io) "SPIIO5, GPIO34, FSPICS0", 29 IO35 (io) "SPIIO6, GPIO35, FSPID", 30 IO36 (io) "SPIIO7, GPIO36, FSPICLK", 31 IO37 (io) "SPIDQS, GPIO37, FSPIQ", 32 IO38 (io) "GPIO38, FSPIWP", 33 IO39/MTCK   (io) "MTCK, GPIO39, CLK_OUT3", 34 IO40/MTDO   (io) "MTDO, GPIO40, CLK_OUT2", 35 IO41/MTDI   (io) "MTDI, GPIO41, CLK_OUT1", 36 IO42/MTMS   (io) "MTMS, GPIO42", 37 TXD0 (io) "GPIO1, U0TXD, CLK_OUT3, EMAC_RXD2", 38 RXD0 (io) "GPIO3, U0RXD, CLK_OUT2", 39 IO45/BOOT_TRAP   (io) "GPIO45, BOOT_TRAP", 40 IO46/BOOT_TRAP   (in) "GPIO46, BOOT_TRAP", 41 EN (in) "Module-enable signal. Active high.", 42 GND (power) "Ground", 43 TP (power)

## ESP32-WROOM-32U
designator U?
Wi-Fi/BT BLE Module ESP32-D0WD; MFR: Espressif; Solder: SMT; Price: None; Value: ESP32-WROOM-32U; Category: MODULE; MPN: ESP32-WROOM-32U; PinCount: 40
footprint ESP32-WROOM-32U (Footprint not found)
pins: 1 GND (power) "Ground", 2 3V3 (power) "Power supply", 3 EN (in) "Module-enable signal. Active high.", 4 SENSOR_VP (in) "GPIO36, ADC1_CH0, RTC_GPIO0", 5 SENSOR_VN (in) "GPIO39, ADC1_CH3, RTC_GPIO3", 6 IO34 (in) "GPIO34, ADC1_CH6, RTC_GPIO4", 7 IO35 (in) "GPIO35, ADC1_CH7, RTC_GPIO5", 8 IO32 (io) "GPIO32, XTAL_32K_P, ADC1_CH4, TOUCH9, RTC_GPIO9", 9 IO33 (io) "GPIO33, XTAL_32K_N, ADC1_CH5,TOUCH8, RTC_GPIO8", 10 IO25 (io) "GPIO25, DAC_1, ADC2_CH8, RTC_GPIO6, EMAC_RXD0", 11 IO26 (io) "GPIO26, DAC_2, ADC2_CH9, RTC_GPIO7, EMAC_RXD1", 12 IO27 (io) "GPIO27, ADC2_CH7, TOUCH7, RTC_GPIO17, EMAC_RX_DV", 13 IO14 (io) "GPIO14, ADC2_CH6, TOUCH6, RTC_GPIO16, MTMS, HSPICLK, HS2_CLK, SD_CLK, EMAC_TXD2", 14 IO12 (io) "GPIO12, ADC2_CH5, TOUCH5, RTC_GPIO15, MTDI, HSPIQ, HS2_DATA2, SD_DATA2, EMAC_TXD3", 15 GND (power) "Ground", 16 IO13 (io) "GPIO13, ADC2_CH4, TOUCH4, RTC_GPIO14, MTCK, HSPID, HS2_DATA3,SD_DATA3, EMAC_RX_ER", 17 SHD/SD2* (io) "GPIO9, SD_DATA2, SPIHD, HS1_DATA2, U1RXD", 18 SWP/SD3* (io) "GPIO10, SD_DATA3, SPIWP, HS1_DATA3, U1TXD", 19 SCS/CMD* (io) "GPIO11, SD_CMD, SPICS0, HS1_CMD, U1RTS", 20 SCK/CLK* (io) "GPIO6, SD_CLK, SPICLK, HS1_CLK, U1CTS", 21 SDO/SD0* (io) "GPIO7, SD_DATA0, SPIQ, HS1_DATA0, U2RTS", 22 SDI/SD1* (io) "GPIO8, SD_DATA1, SPID, HS1_DATA1, U2CTS", 23 IO15 (io) "GPIO15, ADC2_CH3, TOUCH3, MTDO, HSPICS0, RTC_GPIO13, HS2_CMD,SD_CMD, EMAC_RXD3", 24 IO2 (io) "GPIO2, ADC2_CH2, TOUCH2, RTC_GPIO12, HSPIWP, HS2_DATA0,SD_DATA0", 25 IO0 (io) "GPIO0, ADC2_CH1, TOUCH1, RTC_GPIO11, CLK_OUT1, EMAC_TX_CLK", 26 IO4 (io) "GPIO4, ADC2_CH0, TOUCH0, RTC_GPIO10, HSPIHD, HS2_DATA1,SD_DATA1, EMAC_TX_ER", 27 IO16 (io) "GPIO16, HS1_DATA4, U2RXD, EMAC_CLK_OUT", 28 IO17 (io) "GPIO17, HS1_DATA5, U2TXD, EMAC_CLK_OUT_180", 29 IO5 (io) "GPIO5, VSPICS0, HS1_DATA6, EMAC_RX_CLK", 30 IO18 (io) "GPIO18, VSPICLK, HS1_DATA7", 31 IO19 (io) "GPIO19, VSPIQ, U0CTS, EMAC_TXD0", 32 NC, 33 IO21 (io) "GPIO21, VSPIHD, EMAC_TX_EN", 34 RXD0 (io) "GPIO3, U0RXD, CLK_OUT2", 35 TXD0 (io) "GPIO1, U0TXD, CLK_OUT3, EMAC_RXD2", 36 IO22 (io) "GPIO22, VSPIWP, U0RTS, EMAC_TXD1", 37 IO23 (io) "GPIO23, VSPID, HS1_STROBE", 38 GND (power) "Ground", 39 TP (power)